# Altium footprint library sun_library.PcbLib: 412 footprints (part 21 of 26)
Each footprint in its own frame and in the unit in brackets; x right, y up, seen from the top. Pads: shape width x height; smd on the part's side, far side on the other; paste and mask are expansions set on the pad; w line width, h text height; cw(c..) or ccw(c..) is an arc to the next point about the centre after c.
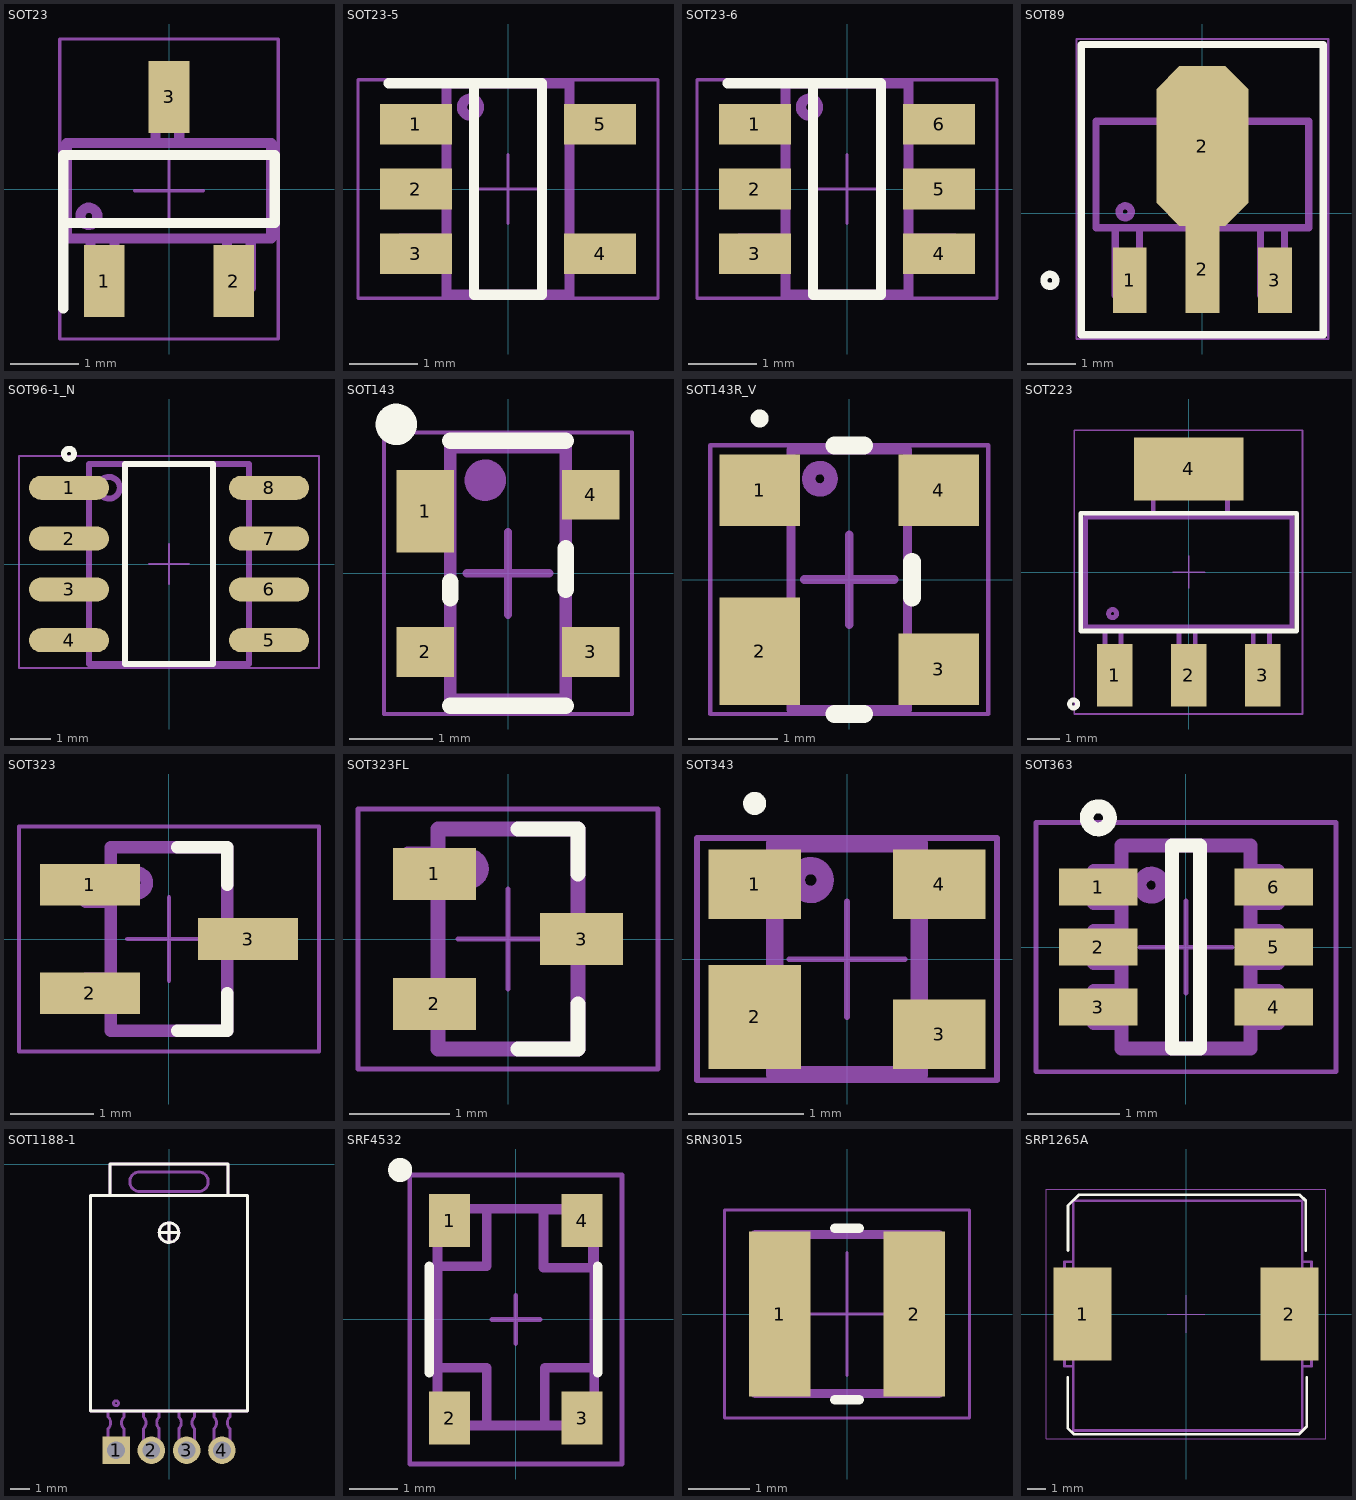
[diagram p20: the footprints below, top view; thin cyan lines are the x and y axes]

## SOT23 [mm] "SOT-23; 3 Leads; Body 3.0 x 2.5 mm, inc. leads (LxW max)"
height 1.1
pads (3):
  rect 0.6x1.05 smd: 1(-0.95,-1.35) 2(0.95,-1.35) 3(0,1.35)
Top Overlay:
  lines w0.15: -1.55,-1.75 -1.55,-0.5 ; -1.55,-0.5 -1.55,0.5 1.55,0.5 1.55,-0.5 -1.55,-0.5
TopAssy 13:
  circle w0.15: c-1.175,-0.4 r0.125
  lines w0.15: -1.15,-0.725 -1.15,-1.4 -0.8,-1.4 -0.8,-0.725 ; -0.2,0.725 -0.2,1.4 0.15,1.4 0.15,0.725 ; 0.85,-0.775 0.85,-1.45 1.2,-1.45 1.2,-0.775 ; -1.5,-0.725 1.5,-0.725 1.5,0.675 -1.5,0.675 -1.5,-0.725
CourtTop 15:
  lines w0.05: -0.5,-0.025 0.5,-0.025 ; 0,-0.525 0,0.475 ; -1.6,-2.2 1.6,-2.2 1.6,2.2 -1.6,2.2 -1.6,-2.2
3D body "SW3dPS-3-lead sot23-3.STEP": height 1, standoff -0.02, extent -1.46,-1.25 1.46,1.226

## SOT23-5 [mm] "SOT23, 5-Leads, Body 2.9x1.6mm, Pitch 0.95mm, Lead Span 2.7mm, IPC Medium Density"
height 1.45
pads (5):
  rect 1.05x0.6 smd: 1(-1.35,0.95) 2(-1.35,0) 3(-1.35,-0.95) 4(1.35,-0.95) 5(1.35,0.95)
Top Overlay:
  lines w0.15: -1.75,1.55 -0.5,1.55 ; -0.5,1.55 0.5,1.55 0.5,-1.55 -0.5,-1.55 -0.5,1.55
TopAssy 13:
  circle w0.15: c-0.55,1.2 r0.125
  lines w0.15: -0.9,-1.075 -1.575,-1.075 -1.575,-0.725 -0.9,-0.725 ; -0.9,-0.15 -1.575,-0.15 -1.575,0.2 -0.9,0.2 ; -0.9,0.775 -1.575,0.775 -1.575,1.125 -0.9,1.125 ; 0.9,-1.1 1.575,-1.1 1.575,-0.75 0.9,-0.75 ; 0.9,0.8 1.575,0.8 1.575,1.15 0.9,1.15 ; -0.9,-1.55 -0.9,1.55 0.9,1.55 0.9,-1.55 -0.9,-1.55
CourtTop 15:
  lines w0.05: -0.5,0 0.5,0 ; 0,-0.5 0,0.5 ; -2.2,-1.6 -2.2,1.6 2.2,1.6 2.2,-1.6 -2.2,-1.6
3D body "User Library-SOT-23-5.STEP": height 1.45, standoff -0.01, extent -1.5,-1.5 1.5,1.5

## SOT23-6 [mm] "SOT23, 6-Leads, Body 2.9x1.6mm, Pitch 0.95mm, Lead Span 2.7mm, IPC Medium Density"
height 1.45
pads (6):
  rect 1.05x0.6 smd: 1(-1.35,0.95) 2(-1.35,0) 3(-1.35,-0.95) 4(1.35,-0.95) 5(1.35,0) 6(1.35,0.95)
Top Overlay:
  lines w0.15: -1.75,1.55 -0.5,1.55 ; -0.5,1.55 -0.5,-1.55 0.5,-1.55 0.5,1.55 -0.5,1.55
TopAssy 13:
  circle w0.15: c-0.55,1.2 r0.125
  lines w0.15: -0.9,-1.075 -1.575,-1.075 -1.575,-0.725 -0.9,-0.725 ; -0.9,-0.15 -1.575,-0.15 -1.575,0.2 -0.9,0.2 ; -0.9,0.775 -1.575,0.775 -1.575,1.125 -0.9,1.125 ; 0.9,-1.075 1.575,-1.075 1.575,-0.725 0.9,-0.725 ; 0.9,-0.15 1.575,-0.15 1.575,0.2 0.9,0.2 ; 0.9,0.775 1.575,0.775 1.575,1.125 0.9,1.125 ; -0.9,-1.55 -0.9,1.55 0.9,1.55 0.9,-1.55 -0.9,-1.55
CourtTop 15:
  lines w0.05: -0.5,0 0.5,0 ; 0,-0.5 0,0.5 ; -2.2,-1.6 -2.2,1.6 2.2,1.6 2.2,-1.6 -2.2,-1.6
3D body "User Library-SOT-23-6-3.step": height 0.86, standoff 0, extent -1.43,-1.5 1.38,1.5

## SOT89 [mm] "SOT-89; Body 4.6 x 4.25 mm, inc. leads (LxW max)"
height 1.6
pads (4):
  rect 0.7x1.35 smd: 1(-1.5,-1.388) 3(1.5,-1.388)
  rect 0.7x1.8 smd: 2(0,-1.162)
  oct 1.9x3.3 smd: 2(0,1.388)
Top Overlay:
  circle w0.15: c-3.15,-1.388 r0.125
  lines w0.15: -2.5,-2.512 -2.5,3.487 2.5,3.487 2.5,-2.512 -2.5,-2.512
TopAssy 13:
  circle w0.15: c-1.595,0.028 r0.125
  lines w0.15: -1.8,-0.3 -1.8,-1.7 -1.3,-1.7 -1.3,-0.3 ; -0.7,1.9 -0.7,2.7 0.7,2.7 0.7,1.9 ; -0.25,-0.3 -0.25,-1.7 0.25,-1.7 0.25,-0.3 ; 1.2,-0.3 1.2,-1.7 1.7,-1.7 1.7,-0.3 ; -2.2,-0.3 -2.2,1.9 2.2,1.9 2.2,-0.3 -2.2,-0.3
CourtTop 15:
  lines w0.05: -0.5,0 0.5,0 ; 0,-0.5 0,0.5 ; -2.6,-2.6 2.6,-2.6 2.6,3.6 -2.6,3.6 -2.6,-2.6
3D body "User Library-SOT-89-1.step": height 1.51, standoff 0, extent -2.25,-1.727 2.25,2.573

## SOT96-1_N [mm] "8-Pin Plastic Small Outline Integrated Circuit 1.27 mm Pitch, IPC Medium Density"
height 1.75
pads (8):
  oval 2x0.6 smd: 1(-2.5,1.905) 2(-2.5,0.635) 3(-2.5,-0.635) 4(-2.5,-1.905) 5(2.5,-1.905) 6(2.5,-0.635) 7(2.5,0.635) 8(2.5,1.905)
Top Overlay:
  circle w0.15: c-2.5,2.755 r0.125
  lines w0.15: -1.1,-2.5 1.1,-2.5 1.1,2.5 -1.1,2.5 -1.1,-2.5
TopAssy 13:
  circle w0.15: c-1.5,1.905 r0.27
  lines w0.15: -2,-2.5 2,-2.5 2,2.5 -2,2.5 -2,-2.5
CourtTop 15:
  lines w0.05: -0.5,0 0.5,0 ; 0,-0.5 0,0.5 ; -3.75,-2.6 3.75,-2.6 3.75,2.7 -3.75,2.7 -3.75,-2.6
3D body "User Library-SOIC-8.STEP": height 1.75, standoff 0, extent -2.906,-2.5 3.106,2.5

## SOT143 [mm] "SOT143, 4-Leads, Body 2.9x1.3mm, Pitch 1.9mm, Lead Span 2.4mm, IPC Low Density"
height 1.22
pads (4):
  rect 0.7x1 smd: 1(-1,0.75)
  rect 0.7x0.6 smd: 2(-1,-0.95) 3(1,-0.95) 4(1,0.95)
Top Overlay:
  circle w0.25: c-1.35,1.8 r0.125
  lines w0.2: -0.7,-1.6 0.7,-1.6 ; -0.7,-0.3 -0.7,-0.1 ; -0.7,1.6 0.7,1.6 ; 0.7,-0.2 0.7,0.3
TopAssy 13:
  circle w0.25: c-0.275,1.125 r0.125
  lines w0.15: -1.225,-0.825 -1.225,-1.1 -0.7,-1.1 ; -1.225,-0.8 -0.7,-0.8 ; -0.7,0.4 -1.2,0.4 -1.2,1.1 -0.7,1.1 ; 0.7,-1.1 1.225,-1.1 ; 0.7,-0.8 1.225,-0.8 1.225,-1.075 ; 0.7,0.8 1.225,0.8 ; 0.7,1.1 1.225,1.1 1.225,0.825 ; -0.7,-1.525 -0.7,1.525 0.7,1.525 0.7,-1.525 -0.7,-1.525
CourtTop 15:
  lines w0.05: -1.5,-1.7 1.5,-1.7 1.5,1.7 -1.5,1.7 -1.5,-1.7
  lines w0.1: -0.5,0 0.5,0 ; 0,-0.5 0,0.5
3D body "SOT-143.STEP": height 1, standoff 0, extent -1.21,-1.46 1.21,1.46

## SOT143R_V [mm] "SOT143, 4-Leads, Body 2.9x1.3 mm"
height 1.1
pads (4):
  rect 0.9x0.8 smd: 1(-1,1) 3(1,-1) 4(1,1)
  rect 0.9x1.2 smd: 2(-1,-0.8)
Top Overlay:
  circle w0.1: c-1,1.8 r0.05
  lines w0.2: -0.163,-1.5 0.163,-1.5 ; -0.163,1.5 0.163,1.5 ; 0.7,-0.2 0.7,0.2
TopAssy 13:
  circle w0.15: c-0.328,1.127 r0.125
  lines w0.1: -0.65,-1.45 -0.65,1.45 0.65,1.45 0.65,-1.45 -0.65,-1.45
CourtTop 15:
  lines w0.05: -1.55,-1.5 -1.55,1.5 1.55,1.5 1.55,-1.5 -1.55,-1.5
  lines w0.1: -0.5,0 0.5,0 ; 0,-0.5 0,0.5
3D body: height 1.1, standoff 0.1, extent -0.65,-1.45 0.65,1.45

## SOT223 [mm] "SOT-223/SC-73; 4 Leads; Body 6.7 x 7.3 mm, inc. leads (LxW max)"
height 1.8
pads (4):
  rect 1.1x1.95 smd: 1(-2.3,-3.2) 2(0,-3.2) 3(2.3,-3.2)
  rect 3.4x1.95 smd: 4(0,3.2)
Top Overlay:
  circle w0.15: c-3.57,-4.09 r0.125
  lines w0.15: -3.35,-1.825 -3.35,1.825 3.35,1.825 3.35,-1.825 -3.35,-1.825
TopAssy 13:
  circle w0.15: c-2.361,-1.287 r0.125
  lines w0.15: -2.6,-1.7 -2.6,-3.4 -2.1,-3.4 -2.1,-1.7 ; -1.1,1.7 -1.1,3.5 1.2,3.5 1.2,1.7 ; -0.3,-1.7 -0.3,-3.4 0.2,-3.4 0.2,-1.7 ; 2,-1.7 2,-3.4 2.5,-3.4 2.5,-1.7 ; -3.2,-1.7 -3.2,1.7 3.2,1.7 3.2,-1.7 -3.2,-1.7
CourtTop 15:
  lines w0.05: -0.5,0 0.5,0 ; 0,-0.5 0,0.5 ; -3.55,-4.4 -3.55,4.4 3.525,4.4 3.525,-4.4 -3.55,-4.4
3D body "User Library-SOT-223-1.step": height 1.73, standoff 0.08, extent -3.274,-3.703 3.226,3.297

## SOT323 [mm] "SOT323, 3-Leads, Body 2.0x1.3mm, Pitch 0.65mm, Lead Span 2.1mm, IPC Medium Density"
height 1.1
pads (3):
  rect 1.2x0.5 smd: 1(-0.95,0.65) 2(-0.95,-0.65) 3(0.95,0)
Top Overlay:
  lines w0.15: 0.1,-1.1 0.7,-1.1 0.7,-0.65 ; 0.1,1.1 0.7,1.1 0.7,0.65
TopAssy 13:
  circle w0.15: c-0.391,0.673 r0.125
  lines w0.15: -0.7,-0.825 -1,-0.825 -1,-0.475 -0.7,-0.475 ; -0.7,0.45 -1,0.45 -1,0.8 -0.7,0.8 ; 0.7,-0.175 1,-0.175 1,0.175 0.7,0.175 ; -0.7,-1.1 0.7,-1.1 0.7,1.1 -0.7,1.1 -0.7,-1.1
CourtTop 15:
  lines w0.05: -0.5,0 0.5,0 ; 0,-0.5 0,0.5 ; -1.8,-1.35 1.8,-1.35 1.8,1.35 -1.8,1.35 -1.8,-1.35
3D body "User Library-SOT323 (SC70-3)-1.STEP": height 1.1, standoff 0, extent -1.122,-1.1 1.123,1.1

## SOT323FL [mm] "SOT323, 3-Leads, Body 2.0x1.3mm, Pitch 0.65mm, Lead Span 2.1mm, IPC Medium Density"
height 1.1
pads (3):
  rect 0.83x0.52 smd: 1(-0.735,0.65) 2(-0.735,-0.65) 3(0.735,0)
Top Overlay:
  lines w0.15: 0.1,-1.1 0.7,-1.1 0.7,-0.65 ; 0.1,1.1 0.7,1.1 0.7,0.65
TopAssy 13:
  circle w0.15: c-0.392,0.701 r0.125
  lines w0.15: -0.7,-0.825 -1,-0.825 -1,-0.475 -0.7,-0.475 ; -0.7,0.5 -1,0.5 -1,0.85 -0.7,0.85 ; 0.7,-0.175 1,-0.175 1,0.175 0.7,0.175 ; -0.7,-1.1 -0.7,1.1 0.7,1.1 0.7,-1.1 -0.7,-1.1
CourtTop 15:
  lines w0.05: -0.5,0 0.5,0 ; 0,-0.5 0,0.5 ; -1.5,-1.3 -1.5,1.3 1.5,1.3 1.5,-1.3 -1.5,-1.3
3D body "User Library-BC847BW.step": height 0.91, standoff -0.04, extent -1.05,-1 1.05,1

## SOT343 [mm] "SOT343, 4-Leads, Body 2x1.25 mm"
height 1
pads (4):
  rect 0.8x0.6 smd: 1(-0.8,0.65) 3(0.8,-0.65) 4(0.8,0.65)
  rect 0.8x0.9 smd: 2(-0.8,-0.5)
Top Overlay:
  circle w0.1: c-0.8,1.35 r0.05
TopAssy 13:
  circle w0.15: c-0.314,0.686 r0.125
  lines w0.15: -0.625,-0.8 -1,-0.8 -1,-0.2 -0.625,-0.2 ; -0.625,0.5 -1,0.5 -1,0.8 -0.625,0.8 ; 0.625,-0.8 1,-0.8 1,-0.5 0.625,-0.5 ; 0.625,0.5 1,0.5 1,0.8 0.625,0.8 ; -0.625,-1 -0.625,1 0.625,1 0.625,-1 -0.625,-1
CourtTop 15:
  lines w0.05: -0.5,0 0.5,0 ; 0,-0.5 0,0.5 ; -1.3,-1.05 -1.3,1.05 1.3,1.05 1.3,-1.05 -1.3,-1.05
3D body "User Library-SOT343-1.step": height 1, standoff 0, extent -1.1,-1.1 1.1,1.1

## SOT363 [mm] "SOT363, 6-Leads, Body 2x1.3mm, Pitch 0.65mm, Lead Span 2.1mm, IPC Medium Density"
height 1.1
pads (6):
  rect 0.85x0.4 smd mask+0.075: 1(-0.95,0.65) 2(-0.95,0) 3(-0.95,-0.65) 4(0.95,-0.65) 5(0.95,0) 6(0.95,0.65)
Top Overlay:
  circle w0.15: c-0.95,1.4 r0.125
  lines w0.15: -0.15,-1.1 -0.15,1.1 0.15,1.1 0.15,-1.1 -0.15,-1.1
TopAssy 13:
  circle w0.15: c-0.376,0.671 r0.125
  lines w0.15: -0.7,-0.825 -1,-0.825 -1,-0.475 -0.7,-0.475 ; -0.7,-0.175 -1,-0.175 -1,0.175 -0.7,0.175 ; -0.7,0.475 -1,0.475 -1,0.825 -0.7,0.825 ; 0.7,-0.825 1,-0.825 1,-0.475 0.7,-0.475 ; 0.7,-0.175 1,-0.175 1,0.175 0.7,0.175 ; 0.7,0.475 1,0.475 1,0.825 0.7,0.825 ; -0.7,-1.1 0.7,-1.1 0.7,1.1 -0.7,1.1 -0.7,-1.1
CourtTop 15:
  lines w0.05: -0.5,0 0.5,0 ; 0,-0.5 0,0.5 ; -1.625,-1.35 1.625,-1.35 1.625,1.35 -1.625,1.35 -1.625,-1.35
3D body "User Library-SOT-363.step": height 1.04, standoff -0.01, extent -1.131,-1 1.131,1

## SOT1188-1 [mm] "KMA220 Dual channel programmable angle sensor; Pitch 1.8 mm"
height 2
pads (4):
  rect 1.4x1.4 hole 0.9: 1(-2.7,-14.6)
  round 1.4 hole 0.9: 2(-0.9,-14.6) 3(0.9,-14.6) 4(2.7,-14.6)
Top Overlay:
  circle w0.15: c0,-3.5 r0.5
  lines w0.15: -3,-1.6 -3,0 3,0 3,-1.6 ; -0.5,-3.5 0.5,-3.5 ; 0,-4 0,-3 ; -4,-12.6 4,-12.6 4,-1.6 -4,-1.6 -4,-12.6
TopAssy 13:
  circle w0.15: c-2.7,-12.2 r0.125
  circle w0.15: c0,-3.5 r0.5
  lines w0.15: -3.1,-14.2 -2.3,-14.2 ; -3.1,-12.6 -3.1,-12.9 cw(c-3.4,-13.2) -3.1,-13.5 -3.1,-14.6 -2.3,-14.6 -2.3,-13.5 cw(c-2,-13.2) -2.3,-12.9 -2.3,-12.6 ; -3,-1.6 -3,0 3,0 3,-1.6 ; -1.3,-14.2 -0.5,-14.2 ; -1.3,-12.6 -1.3,-12.9 cw(c-1.6,-13.2) -1.3,-13.5 -1.3,-14.6 -0.5,-14.6 -0.5,-13.5 cw(c-0.2,-13.2) -0.5,-12.9 -0.5,-12.6 ; -0.5,-3.5 0.5,-3.5 ; 0,-4 0,-3 ; 0.5,-14.2 1.3,-14.2 ; 0.5,-12.6 0.5,-12.9 cw(c0.2,-13.2) 0.5,-13.5 0.5,-14.6 1.3,-14.6 1.3,-13.5 cw(c1.6,-13.2) 1.3,-12.9 1.3,-12.6 ; 2.3,-14.2 3.1,-14.2 ; 2.3,-12.6 2.3,-12.9 cw(c2,-13.2) 2.3,-13.5 2.3,-14.6 3.1,-14.6 3.1,-13.5 cw(c3.4,-13.2) 3.1,-12.9 3.1,-12.6 ; -4,-12.6 -4,-1.6 4,-1.6 4,-12.6 -4,-12.6 ; -1.5,-1.4 cw(c-1.5,-0.9) -1.5,-0.4 1.5,-0.4 cw(c1.5,-0.9) 1.5,-1.4 -1.5,-1.4

## SRF4532 [mm] "B82790C0/S0"
height 5.2
pads (4):
  rect 0.85x1.1 smd: 1(-1.375,2.05) 2(-1.375,-2.05) 3(1.375,-2.05) 4(1.375,2.05)
Top Overlay:
  circle w0.25: c-2.4,3.1 r0.125
  lines w0.2: -1.8,-1.1 -1.8,1.1 ; 1.7,-1.1 1.7,1.1
TopAssy 13:
  lines w0.2: -1.625,-2.2 -0.6,-2.2 -0.6,-1 -1.625,-1 -1.625,-2.2 ; -1.625,-2.2 1.625,-2.2 ; -1.625,-2.2 -1.625,2.3 ; -1.625,2.3 -1.625,1.1 -0.6,1.1 -0.6,2.3 -1.625,2.3 ; -1.625,2.3 1.625,2.3 1.625,-2.2 ; 1.625,-2.2 0.6,-2.2 0.6,-1 1.625,-1 1.625,-2.2 ; 0.575,1.075 0.575,2.275 1.6,2.275 1.6,1.075 0.575,1.075
CourtTop 15:
  lines w0.1: -0.5,0 0.5,0 ; 0,-0.5 0,0.5 ; -2.2,-3 -2.2,3 2.2,3 2.2,-3 -2.2,-3
3D body "SRF4532.stp": height 2.81, standoff 0.01, extent -1.6,-2.25 1.6,2.25

## SRN3015 [mm] "SMT power inductors, SRN3015 series, BOURNS"
height 1
pads (2):
  rect 1x2.7 smd: 1(-1.1,0) 2(1.1,0)
Top Overlay:
  lines w0.15: -0.2,-1.4 0.2,-1.4 ; -0.2,1.4 0.2,1.4
TopAssy 13:
  lines w0.15: -1.5,-1.3 -1.1,-1.3 -1.1,1.3 -1.5,1.3 ; -1.5,-1.3 -1.5,1.3 ; -1.5,-1.3 1.5,-1.3 ; -1.5,-1.3 -1.5,1.3 ; -1.5,1.3 1.5,1.3 ; 1.5,-1.3 1.1,-1.3 1.1,1.3 1.5,1.3 ; 1.5,-1.3 1.5,1.3 ; 1.5,-1.3 1.5,1.3
CourtTop 15:
  lines w0.05: -1,0 1,0 ; 0,-1 0,1 ; -2,-1.7 2,-1.7 2,1.7 -2,1.7 -2,-1.7
3D body "User Library-Inductor SRN3015 Series.step": height 1.64, standoff 0.14, extent -1.51,-1.362 1.51,1.362

## SRP1265A [mm] "SMT power inductors, SRP1265A series BOURNS"
height 6.2
pads (2):
  rect 3.1x5 smd paste-2: 1(-5.55,0) 2(5.55,0)
Top Overlay:
  lines w0.15: -6.35,-3.4 -6.35,-6.125 -6.025,-6.45 6.075,-6.45 6.475,-6.05 6.475,-3.4 ; -6.325,3.4 -6.325,5.825 -5.75,6.4 6.1,6.4 6.425,6.075 6.425,3.4
Top Paste:
  rectangle: 4,0.275 7.1,2.5
  region: 7.1,-0.275 4,-0.275 4,-2.5 7.1,-2.5
  region: -4,-0.275 -7.1,-0.275 -7.1,-2.5 -4,-2.5
  rectangle: -7.1,0.275 -4,2.5
TopAssy 13:
  lines w0.15: -6.05,-2.8 -6.525,-2.8 -6.525,2.8 -6.05,2.8 ; 6.238,-2.8 6.738,-2.8 6.738,2.8 6.238,2.8 ; -6.05,-6.25 -6.05,6.075 6.238,6.075 6.238,-6.25 -6.05,-6.25
CourtTop 15:
  lines w0.05: -1,0 1,0 ; 0,-1 0,1 ; -7.5,-6.7 -7.5,6.7 7.5,6.7 7.5,-6.7 -7.5,-6.7
3D body "SRP1265A series.stp": height 6.51, standoff 0.2, extent -6.3,-6.4 6.6,6.1